# Altium footprint library PCB_IntegratedCircuit.PcbLib: 82 footprints (part 1 of 6)
Each footprint in its own frame and in the unit in brackets; x right, y up, seen from the top. Pads: shape width x height; smd on the part's side, far side on the other; paste and mask are expansions set on the pad; w line width, h text height; cw(c..) or ccw(c..) is an arc to the next point about the centre after c.
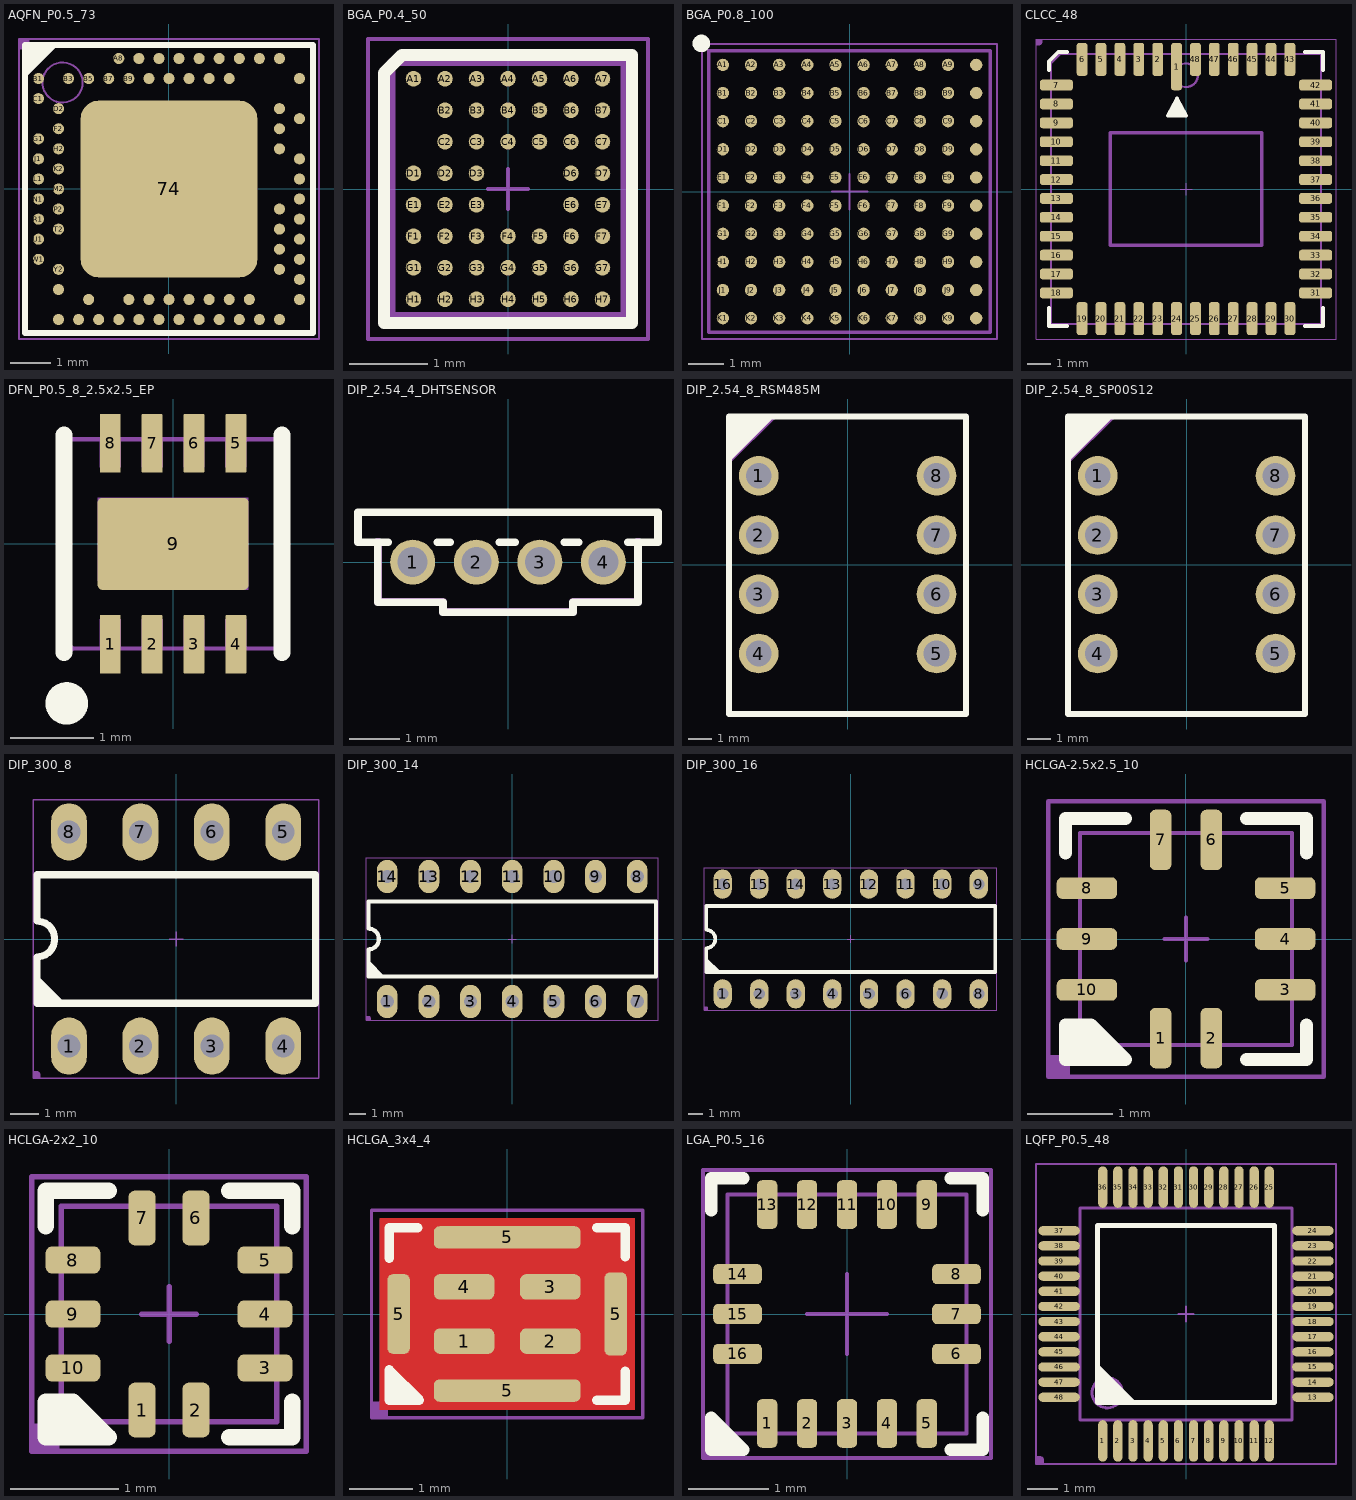
[diagram p0: the footprints below, top view; thin cyan lines are the x and y axes]

## AQFN_P0.5_73 [mm]
height 0.85
pads (74):
  rrect20% 4.4x4.4 smd mask+0.05: 74(0,0)
  round 0.275 smd paste+0.012 mask+0.05: A8(-1.25,3.25) A10(-0.75,3.25) A12(-0.25,3.25) A14(0.25,3.25) A16(0.75,3.25) A18(1.25,3.25) A20(1.75,3.25) A22(2.25,3.25) A23(2.75,3.25) AA24(3.25,-2.25) AB2(-2.75,-2.5) AC5(-2,-2.75) AC9(-1,-2.75) AC11(-0.5,-2.75) AC13(0,-2.75) AC15(0.5,-2.75) AC17(1,-2.75) AC19(1.5,-2.75) AC21(2,-2.75) AC24(3.25,-2.75) AD2(-2.75,-3.25) AD4(-2.25,-3.25) AD6(-1.75,-3.25) AD8(-1.25,-3.25) AD10(-0.75,-3.25) AD12(-0.25,-3.25) AD14(0.25,-3.25) AD16(0.75,-3.25) AD18(1.25,-3.25) AD20(1.75,-3.25) AD22(2.25,-3.25) AD23(2.75,-3.25) B1(-3.25,2.75) B3(-2.5,2.75) B5(-2,2.75) B7(-1.5,2.75) B9(-1,2.75) B11(-0.5,2.75) B13(0,2.75) B15(0.5,2.75) B17(1,2.75) B19(1.5,2.75) B24(3.25,2.75) C1(-3.25,2.25) D2(-2.75,2) D23(2.75,2) E24(3.25,1.75) F2(-2.75,1.5) F23(2.75,1.5) G1(-3.25,1.25) H2(-2.75,1) H23(2.75,1) J1(-3.25,0.75) J24(3.25,0.75) K2(-2.75,0.5) L1(-3.25,0.25) L24(3.25,0.25) M2(-2.75,0) N1(-3.25,-0.25) N24(3.25,-0.25) P2(-2.75,-0.5) P23(2.75,-0.5) R1(-3.25,-0.75) R24(3.25,-0.75) T2(-2.75,-1) T23(2.75,-1) U1(-3.25,-1.25) U24(3.25,-1.25) V23(2.75,-1.5) W1(-3.25,-1.75) W24(3.25,-1.75) Y2(-2.75,-2) Y23(2.75,-2)
Top Overlay:
  region: -2.769,3.581 -3.581,2.769 -3.581,3.581
  lines w0.152: -3.581,-3.581 3.581,-3.581 3.581,3.581 -3.581,3.581 -3.581,-3.581
Mechanical 13:
  circle w0.051: c-2.65,2.65 r0.5
  lines w0.051: -0.5,0 0.5,0 ; 0,-0.5 0,0.5 ; -3.531,-3.531 3.531,-3.531 3.531,3.531 -3.531,3.531 -3.531,-3.531
T-Component:
  region: -3.734,3.734 -3.48,3.734 -3.48,3.607 -3.48,3.582 -3.499,3.535 -3.535,3.499 -3.582,3.48 -3.607,3.48 -3.734,3.48
  lines w0.051: -3.734,-3.734 -3.734,3.734 3.734,3.734 3.734,-3.734 -3.734,-3.734
3D body "LGA88C25P25X25_700X700X85.step": height 0.85, standoff 0, extent -3.55,-3.55 3.55,3.55

## BGA_P0.4_50 [mm]
height 0.4
pads (50):
  round 0.198 smd: A1(-1.2,1.4) A2(-0.8,1.4) A3(-0.4,1.4) A4(0,1.4) A5(0.4,1.4) A6(0.8,1.4) A7(1.2,1.4) B2(-0.8,1) B3(-0.4,1) B4(0,1) B5(0.4,1) B6(0.8,1) B7(1.2,1) C2(-0.8,0.6) C3(-0.4,0.6) C4(0,0.6) C5(0.4,0.6) C6(0.8,0.6) C7(1.2,0.6) D1(-1.2,0.2) D2(-0.8,0.2) D3(-0.4,0.2) D6(0.8,0.2) D7(1.2,0.2) E1(-1.2,-0.2) E2(-0.8,-0.2) E3(-0.4,-0.2) E6(0.8,-0.2) E7(1.2,-0.2) F1(-1.2,-0.6) F2(-0.8,-0.6) F3(-0.4,-0.6) F4(0,-0.6) F5(0.4,-0.6) F6(0.8,-0.6) F7(1.2,-0.6) G1(-1.2,-1) G2(-0.8,-1) G3(-0.4,-1) G4(0,-1) G5(0.4,-1) G6(0.8,-1) G7(1.2,-1) H1(-1.2,-1.4) H2(-0.8,-1.4) H3(-0.4,-1.4) H4(0,-1.4) H5(0.4,-1.4) H6(0.8,-1.4) H7(1.2,-1.4)
Top Overlay:
  lines w0.152: -1.575,-1.702 1.575,-1.702 1.575,1.702 -1.346,1.702 -1.575,1.473 -1.575,-1.702
Mechanical 13:
  lines w0.051: -0.254,0 0.254,0 ; 0,-0.254 0,0.254
  lines w0.1: -1.48,-1.615 1.48,-1.615 1.48,1.615 -1.48,1.615 -1.48,-1.615
T-Component:
  lines w0.051: -1.778,-1.905 1.778,-1.905 1.778,1.905 -1.778,1.905 -1.778,-1.905
3D body "BGA56C40P7X8_296X323X40.step": height 0.4, standoff 0, extent -1.48,-1.615 1.48,1.615

## BGA_P0.8_100 [mm]
height 1.1
pads (100):
  round 0.35 smd: A1(-3.6,3.6) A2(-2.8,3.6) A3(-2,3.6) A4(-1.2,3.6) A5(-0.4,3.6) A6(0.4,3.6) A7(1.2,3.6) A8(2,3.6) A9(2.8,3.6) A10(3.6,3.6) B1(-3.6,2.8) B2(-2.8,2.8) B3(-2,2.8) B4(-1.2,2.8) B5(-0.4,2.8) B6(0.4,2.8) B7(1.2,2.8) B8(2,2.8) B9(2.8,2.8) B10(3.6,2.8) C1(-3.6,2) C2(-2.8,2) C3(-2,2) C4(-1.2,2) C5(-0.4,2) C6(0.4,2) C7(1.2,2) C8(2,2) C9(2.8,2) C10(3.6,2) D1(-3.6,1.2) D2(-2.8,1.2) D3(-2,1.2) D4(-1.2,1.2) D5(-0.4,1.2) D6(0.4,1.2) D7(1.2,1.2) D8(2,1.2) D9(2.8,1.2) D10(3.6,1.2) E1(-3.6,0.4) E2(-2.8,0.4) E3(-2,0.4) E4(-1.2,0.4) E5(-0.4,0.4) E6(0.4,0.4) E7(1.2,0.4) E8(2,0.4) E9(2.8,0.4) E10(3.6,0.4) F1(-3.6,-0.4) F2(-2.8,-0.4) F3(-2,-0.4) F4(-1.2,-0.4) F5(-0.4,-0.4) F6(0.4,-0.4) F7(1.2,-0.4) F8(2,-0.4) F9(2.8,-0.4) F10(3.6,-0.4) G1(-3.6,-1.2) G2(-2.8,-1.2) G3(-2,-1.2) G4(-1.2,-1.2) G5(-0.4,-1.2) G6(0.4,-1.2) G7(1.2,-1.2) G8(2,-1.2) G9(2.8,-1.2) G10(3.6,-1.2) H1(-3.6,-2) H2(-2.8,-2) H3(-2,-2) H4(-1.2,-2) H5(-0.4,-2) H6(0.4,-2) H7(1.2,-2) H8(2,-2) H9(2.8,-2) H10(3.6,-2) J1(-3.6,-2.8) J2(-2.8,-2.8) J3(-2,-2.8) J4(-1.2,-2.8) J5(-0.4,-2.8) J6(0.4,-2.8) J7(1.2,-2.8) J8(2,-2.8) J9(2.8,-2.8) J10(3.6,-2.8) K1(-3.6,-3.6) K2(-2.8,-3.6) K3(-2,-3.6) K4(-1.2,-3.6) K5(-0.4,-3.6) K6(0.4,-3.6) K7(1.2,-3.6) K8(2,-3.6) K9(2.8,-3.6) K10(3.6,-3.6)
Top Overlay:
  circle w0.25: c-4.21,4.21 r0.125
Mechanical 13:
  lines w0.1: -4,-4 -4,4 4,4 4,-4 -4,-4
T-Component:
  lines w0.051: -0.508,0 0.508,0 ; 0,-0.508 0,0.508 ; -4.191,-4.191 -4.191,4.191 4.191,4.191 4.191,-4.191 -4.191,-4.191
3D body "BGA100C80P10X10_800X800X110.step": height 1.1, standoff 0, extent -4,-4 4,4

## CLCC_48 [mil]
height 90.55
pads (48):
  rrect50% 18x79 smd: 1(-15.75,204)
  rrect50% 18x55 smd: 2(-47.24,216) 3(-78.74,216) 4(-110.24,216) 5(-141.73,216) 6(-173.23,216) 19(-173.23,-216) 20(-141.73,-216) 21(-110.24,-216) 22(-78.74,-216) 23(-47.24,-216) 24(-15.75,-216) 25(15.75,-216) 26(47.24,-216) 27(78.74,-216) 28(110.24,-216) 29(141.73,-216) 30(173.23,-216) 43(173.23,216) 44(141.73,216) 45(110.24,216) 46(78.74,216) 47(47.24,216) 48(15.75,216)
  rrect50% 55x18 smd: 7(-216,173.23) 8(-216,141.73) 9(-216,110.24) 10(-216,78.74) 11(-216,47.24) 12(-216,15.75) 13(-216,-15.75) 14(-216,-47.24) 15(-216,-78.74) 16(-216,-110.24) 17(-216,-141.73) 18(-216,-173.23) 31(216,-173.23) 32(216,-141.73) 33(216,-110.24) 34(216,-78.74) 35(216,-47.24) 36(216,-15.75) 37(216,15.75) 38(216,47.24) 39(216,78.74) 40(216,110.24) 41(216,141.73) 42(216,173.23)
Top Overlay:
  region: -15,151 -30.26,122 0.26,122
  lines w6: -228.35,-197.83 -228.35,-228.35 -197.83,-228.35 ; -228.35,197.83 -228.35,213.09 -213.09,228.35 -197.83,228.35 ; 197.83,-228.35 228.35,-228.35 228.35,-197.83 ; 197.83,228.35 228.35,228.35 228.35,197.83 ; -30.26,122 0.26,122 -15,151 -30.26,122
Mechanical 13:
  circle w3.94: c0,189.57 r19.68
  lines w2: -10,0 10,0 ; 0,-10 0,10
  lines w3.94: -225,-225 -225,209.74 -209.74,225 225,225 225,-225 -225,-225
  lines w6: -126,-94 -126,94 126,94 126,-94 -126,-94
T-Component:
  region: -250,250 -240,250 -240,245 -240,244.01 -240.76,242.17 -242.17,240.76 -244.01,240 -245,240 -250,240
  lines w2: -250,-250 250,-250 250,250 -250,250 -250,-250
3D body "User Library-CLCC48.STEP": height 79.69, standoff 0, extent -250,-250 250,250

## DFN_P0.5_8_2.5x2.5_EP [mm]
pads (9):
  rrect10% 0.25x0.7 smd: 1(-0.75,-1.2) 2(-0.25,-1.2) 3(0.25,-1.2) 4(0.75,-1.2) 5(0.75,1.2) 6(0.25,1.2) 7(-0.25,1.2) 8(-0.75,1.2)
  rrect10% 1.8x1.1 smd: 9(0,0)
Top Overlay:
  lines w0.203: -1.3,-1.3 -1.3,1.3 ; 1.3,-1.3 1.3,1.3
  lines w0.254: -1.271,-1.778 ccw(c-1.27,-1.905) -1.269,-1.778
B-Component:
  region: -0.9,-0.44 -0.9,0.55 0.9,0.55 0.9,-0.55 -0.79,-0.55
  region: -0.875,-1.25 -0.875,-0.9 -0.625,-0.9 -0.625,-1.25
  region: -0.375,-1.25 -0.375,-0.9 -0.125,-0.9 -0.125,-1.25
  region: 0.125,-1.25 0.125,-0.9 0.375,-0.9 0.375,-1.25
  region: 0.625,-1.25 0.625,-0.9 0.875,-0.9 0.875,-1.25
  region: 0.625,1.263 0.625,0.913 0.875,0.913 0.875,1.263
  region: 0.125,1.263 0.125,0.913 0.375,0.913 0.375,1.263
  region: -0.375,1.263 -0.375,0.913 -0.125,0.913 -0.125,1.263
  region: -0.875,1.263 -0.875,0.913 -0.625,0.913 -0.625,1.263
  region: -1.19,-1.25 -1.19,-1.225 -1.225,-1.19 -1.275,-1.19 -1.31,-1.225 -1.31,-1.25 -1.31,-1.275 -1.275,-1.31 -1.225,-1.31 -1.19,-1.275
  lines w0.051: -1.25,-1.25 1.25,-1.25 1.25,1.25 -1.25,1.25 -1.25,-1.25
3D body "User Library-DFN8 2_5x2_5mm.step": height 1.06, standoff 0.04, extent -1.25,-1.26 1.25,1.26

## DIP_2.54_4_DHTSENSOR [mm]
pads (4):
  round 0.9 hole 0.6: 1(-1.905,0) 2(-0.635,0) 3(0.635,0) 4(1.905,0)
Top Overlay:
  lines w0.152: -2.601,0.4 -2.601,-0.8 -1.3,-0.8 -1.3,-1 1.3,-1 1.3,-0.8 2.6,-0.8 2.6,0.4 ; -2.391,0.4 -3,0.4 -3,1 3,1 3,0.4 2.6,0.4 ; -1.419,0.4 -1.151,0.4 ; -0.179,0.4 0.149,0.4 ; 1.121,0.4 1.419,0.4 ; 2.391,0.4 2.6,0.4
Mechanical 6:
  region: -2.525,0.4 -2.525,-0.724 -1.3,-0.724 -1.285,-0.724 -1.257,-0.736 -1.236,-0.757 -1.224,-0.785 -1.224,-0.8 -1.224,-0.924 1.224,-0.924 1.224,-0.8 1.224,-0.785 1.236,-0.757 1.257,-0.736 1.285,-0.724 1.3,-0.724 2.524,-0.724 2.524,0.4 2.524,0.431 2.569,0.476 2.631,0.476 2.676,0.431 2.676,0.4 2.676,-0.8 2.676,-0.815 2.664,-0.843 2.643,-0.864 2.615,-0.876 2.6,-0.876 1.376,-0.876 1.376,-1 1.376,-1.015 1.364,-1.043 1.343,-1.064 1.315,-1.076 1.3,-1.076 -1.3,-1.076 -1.315,-1.076 -1.343,-1.064 -1.364,-1.043 -1.376,-1.015 -1.376,-1 -1.376,-0.876 -2.601,-0.876 -2.617,-0.876 -2.644,-0.864 -2.666,-0.843 -2.677,-0.815 -2.677,-0.8 -2.677,0.4 -2.677,0.431 -2.633,0.476 -2.57,0.476 -2.525,0.431
B-Component:
  region: 1.705,0.2 2.105,0.2 2.105,-0.2 1.705,-0.2
  region: 0.435,0.2 0.835,0.2 0.835,-0.2 0.435,-0.2
  region: -0.835,0.2 -0.435,0.2 -0.435,-0.2 -0.835,-0.2
  region: -2.105,0.2 -1.705,0.2 -1.705,-0.2 -2.105,-0.2
  lines w0.051: -3,0.4 -3,1 3,1 3,0.4 2.6,0.4 2.6,-0.8 1.3,-0.8 1.3,-1 -1.3,-1 -1.3,-0.8 -2.6,-0.8 -2.6,0.4 -3,0.4
3D body "3D_PCB1_2024-05-11.step": height 14.72, standoff -2.98, extent -3,-1 3,1

## DIP_2.54_8_RSM485M [mm]
pads (8):
  round 1.7 hole 1.1: 1(-3.81,3.81) 2(-3.81,1.27) 3(-3.81,-1.27) 4(-3.81,-3.81) 5(3.81,-3.81) 6(3.81,-1.27) 7(3.81,1.27) 8(3.81,3.81)
Top Overlay:
  region: -5.08,6.35 -5.08,4.42 -3.15,6.35
  lines w0.254: -5.08,-6.401 5.08,-6.401 5.08,6.35 -5.08,6.35 -5.08,-6.401
Mechanical 6:
  region: -5.08,6.35 -5.08,4.318 -3.048,6.35
B-Component:
  drawing of 13 lines, arcs and shapes, not listed
3D body "3D_PCB1_2024-05-09.step": height 7.72, standoff -3.48, extent -5.1,-6.4 5.1,6.4

## DIP_2.54_8_SP00S12 [mm]
pads (8):
  round 1.7 hole 1.1: 1(-3.81,3.81) 2(-3.81,1.27) 3(-3.81,-1.27) 4(-3.81,-3.81) 5(3.81,-3.81) 6(3.81,-1.27) 7(3.81,1.27) 8(3.81,3.81)
Top Overlay:
  region: -5.08,6.35 -5.08,4.42 -3.15,6.35
  lines w0.254: -5.08,-6.401 5.08,-6.401 5.08,6.35 -5.08,6.35 -5.08,-6.401
Mechanical 6:
  region: -5.08,6.35 -5.08,4.318 -3.048,6.35
B-Component:
  drawing of 13 lines, arcs and shapes, not listed
3D body "3D_PCB1_2024-05-10.step": height 7.72, standoff -3.98, extent -5.105,-6.4 5.105,6.4

## DIP_300_8 [mil]
pads (8):
  oval 50x80 hole 32: 1(-150,-150) 2(-50,-150) 3(50,-150) 4(150,-150) 5(150,150) 6(50,150) 7(-50,150) 8(-150,150)
Top Overlay:
  region: -194.69,-90 -194.69,-50.63 -155.31,-90
  lines w10: -195,-90 195,-90 195,90 -195,90 -195,25 cw(c-195,0) -195,-25 -195,-90
Mechanical 13:
  lines w2: -10,0 10,0 ; 0,-10 0,10
T-Component:
  region: -200,-195 -200,-185 -195,-185 -194.01,-185 -192.17,-185.76 -190.76,-187.17 -190,-189.01 -190,-190 -190,-195
  lines w2: -200,-195 200,-195 200,195 -200,195 -200,-195
3D body "User Library-DIP8test.STEP": height 179.92, standoff -150, extent -195.08,-153.94 195.07,153.94

## DIP_300_14 [mil]
pads (14):
  oval 50x80 hole 32: 1(-300,-150) 2(-200,-150) 3(-100,-150) 4(0,-150) 5(100,-150) 6(200,-150) 7(300,-150) 8(300,150) 9(200,150) 10(100,150) 11(0,150) 12(-100,150) 13(-200,150) 14(-300,150)
Top Overlay:
  region: -344.69,-90 -344.69,-50.63 -305.31,-90
  lines w10: -345,-90 345,-90 345,90 -345,90 -345,25 cw(c-345,0) -345,-25 -345,-90
Mechanical 13:
  lines w2: -10,0 10,0 ; 0,-10 0,10
T-Component:
  region: -350,-195 -350,-185 -345,-185 -344.01,-185 -342.17,-185.76 -340.76,-187.17 -340,-189.01 -340,-190 -340,-195
  lines w2: -350,-195 -350,195 350,195 350,-195 -350,-195
3D body "SW3dPS-DIP14-300.STEP": height 200, standoff -98.03, extent -383.86,-154.92 383.86,154.93

## DIP_300_16 [mil]
pads (16):
  oval 50x80 hole 32: 1(-350,-150) 2(-250,-150) 3(-150,-150) 4(-50,-150) 5(50,-150) 6(150,-150) 7(250,-150) 8(350,-150) 9(350,150) 10(250,150) 11(150,150) 12(50,150) 13(-50,150) 14(-150,150) 15(-250,150) 16(-350,150)
Top Overlay:
  region: -394.69,-90 -394.69,-50.63 -355.31,-90
  lines w10: -395,-90 -395,-25 ccw(c-395,0) -395,25 -395,90 395,90 395,-90 -395,-90
Mechanical 13:
  lines w2: -10,0 10,0 ; 0,-10 0,10
T-Component:
  region: -400,-195 -400,-185 -395,-185 -394.01,-185 -392.17,-185.76 -390.76,-187.17 -390,-189.01 -390,-190 -390,-195
  lines w2: -400,-195 400,-195 400,195 -400,195 -400,-195
3D body "User Library-DIP16-22mm.STEP": height 202.76, standoff -98.03, extent -433.07,-155 433.07,154.84

## HCLGA-2.5x2.5_10 [mil]
height 31.5
pads (10):
  rrect50% 10x28 smd: 1(-11.81,-46) 2(11.81,-46) 6(11.81,46) 7(-11.81,46)
  rrect50% 28x10 smd: 3(46,-23.62) 4(46,0) 5(46,23.62) 8(-46,23.62) 9(-46,0) 10(-46,-23.62)
Top Overlay:
  region: -44,-40 -56,-40 -56,-56 -28,-56
  lines w6: -56,40 -56,56 -28,56 ; 28,-56 56,-56 56,-40 ; 28,56 56,56 56,40 ; -56,-56 -56,-40 -44,-40 -28,-56 -56,-56
Top Solder:
  region: 11.81,-32 -11.81,-32 -11.81,-60 11.81,-60
  region: 11.81,60 -11.81,60 -11.81,32 11.81,32
  region: 32,23.62 32,-23.62 60,-23.62 60,23.62
  region: -32,-23.62 -32,23.62 -60,23.62 -60,-23.62
Mechanical 13:
  lines w2: -10,0 10,0 ; 0,-10 0,10 ; -49.22,-49.21 -49.22,49.22 49.21,49.22 49.21,-49.21 -49.22,-49.21
T-Component:
  region: -64,-64 -64,-54 -59,-54 -58.01,-54 -56.17,-54.76 -54.76,-56.17 -54,-58.01 -54,-59 -54,-64
  lines w2: -64,-64 -64,64 64,64 64,-64 -64,-64
3D body "PQFN60P250X250X80-10N.step": height 31.5, standoff -0.04, extent -49.22,-49.21 49.21,49.22

## HCLGA-2x2_10 [mil]
height 31.5
pads (10):
  rrect50% 10x20 smd: 1(-9.84,-35) 2(9.84,-35) 6(9.84,35) 7(-9.84,35)
  rrect50% 20x10 smd: 3(35,-19.68) 4(35,0) 5(35,19.68) 8(-35,19.68) 9(-35,0) 10(-35,-19.68)
Top Overlay:
  region: -45,-32 -45,-45 -22,-45 -35,-32
  lines w6: -45,32 -45,45 -22,45 ; 22,-45 45,-45 45,-32 ; 22,45 45,45 45,32 ; -45,-45 -22,-45 -35,-32 -45,-32 -45,-45
Top Solder:
  region: 45,-19.69 45,19.69 25,19.69 25,-19.69
  region: -45,19.69 -45,-19.68 -25,-19.69 -25,19.68
  region: 9.84,45 -9.84,45 -9.84,25 9.84,25
  region: 9.84,-25 -9.84,-25 -9.84,-45 9.84,-45
Mechanical 13:
  lines w2: -10,0 10,0 ; 0,-10 0,10 ; -39.37,-39.37 -39.37,39.37 39.37,39.37 39.37,-39.37 -39.37,-39.37
T-Component:
  region: -50,-50 -50,-40 -45,-40 -44.01,-40 -42.17,-40.76 -40.76,-42.17 -40,-44.01 -40,-45 -40,-50
  lines w2: -50,-50 -50,50 50,50 50,-50 -50,-50
3D body "PQFN50P200X200X80-10N.step": height 31.5, standoff -0.04, extent -39.37,-39.37 39.37,39.37

## HCLGA_3x4_4 [mil]
pads (8):
  rrect50% 38x16 smd: 1(-27,-17) 2(27,-17) 3(27,17) 4(-27,17)
  rrect50% 14x50 smd: 5(-68,0)
  rrect50% 92x14 smd: 5(0,-48) 5(0,48)
  rrect50% 14x52 smd: 5(68,0)
Top Layer:
  pour cut-out: -80,-60 -80,60 80,60 80,-60
Top Overlay:
  region: -74,-54 -74,-35 -55,-54
  lines w6: -74,35 -74,54 -56,54 ; 56,-54 74,-54 74,-36 ; 56,54 74,54 74,36 ; -74,-54 -55,-54 -74,-35 -74,-54
Mechanical 13:
  lines w2: -10,0 10,0 ; 0,-10 0,10 ; -79,-59 -79,59 79,59 79,-59 -79,-59
T-Component:
  region: -85,-65 -85,-55 -80,-55 -79.01,-55 -77.17,-55.76 -75.76,-57.17 -75,-59.01 -75,-60 -75,-65
  lines w2: -85,-65 -85,65 85,65 85,-65 -85,-65
3D body "User Library-DFN12(3x4).STEP": height 29.92, standoff 0, extent -78.74,-59.08 78.74,59.1

## LGA_P0.5_16 [mil]
height 29.53
pads (16):
  rrect50% 10x24 smd: 1(-39.37,-54) 2(-19.68,-54) 3(0,-54) 4(19.68,-54) 5(39.37,-54) 9(39.37,54) 10(19.68,54) 11(0,54) 12(-19.68,54) 13(-39.37,54)
  rrect50% 24x10 smd: 6(54,-19.68) 7(54,0) 8(54,19.68) 14(-54,19.68) 15(-54,0) 16(-54,-19.68)
Top Overlay:
  region: -67,-67 -67,-51 -51,-67
  lines w6: -67,51 -67,67 -51,67 ; 51,-67 67,-67 67,-51 ; 51,67 67,67 67,51 ; -67,-67 -51,-67 -67,-51 -67,-67
Top Solder:
  region: 41,20 41,-20 67,-20 67,20
  region: 40,-41 -40,-41 -40,-67 40,-67
  rectangle: -40,41 40,67
  region: -41,-20 -41,20 -67,20 -67,-20
Mechanical 13:
  lines w2: -19.68,0 19.68,0 ; 0,-19.68 0,19.68 ; -59.06,-59.06 -59.06,59.06 59.06,59.06 59.06,-59.06 -59.06,-59.06
T-Component:
  region: -71,-71 -71,-61 -66,-61 -65.01,-61 -63.17,-61.76 -61.76,-63.17 -61,-65.01 -61,-66 -61,-71
  lines w2: -71,-71 -71,71 71,71 71,-71 -71,-71
3D body "PQFN50P300X300X75-16L.step": height 29.53, standoff 0, extent -59.06,-59.06 59.06,59.06

## LQFP_P0.5_48 [mil]
height 62.99
pads (48):
  oval 12x54 smd: 1(-108.27,-165) 2(-88.58,-165) 3(-68.9,-165) 4(-49.21,-165) 5(-29.53,-165) 6(-9.84,-165) 7(9.84,-165) 8(29.53,-165) 9(49.21,-165) 10(68.9,-165) 11(88.58,-165) 12(108.27,-165) 25(108.27,165) 26(88.58,165) 27(68.9,165) 28(49.21,165) 29(29.53,165) 30(9.84,165) 31(-9.84,165) 32(-29.53,165) 33(-49.21,165) 34(-68.9,165) 35(-88.58,165) 36(-108.27,165)
  oval 54x12 smd: 13(165,-108.27) 14(165,-88.58) 15(165,-68.9) 16(165,-49.21) 17(165,-29.53) 18(165,-9.84) 19(165,9.84) 20(165,29.53) 21(165,49.21) 22(165,68.9) 23(165,88.58) 24(165,108.27) 37(-165,108.27) 38(-165,88.58) 39(-165,68.9) 40(-165,49.21) 41(-165,29.53) 42(-165,9.84) 43(-165,-9.84) 44(-165,-29.53) 45(-165,-49.21) 46(-165,-68.9) 47(-165,-88.58) 48(-165,-108.27)
Top Overlay:
  region: -115,-115 -115,-65 -65,-115
  lines w6: -115,-115 115,-115 115,115 -115,115 -115,-115
Mechanical 13:
  circle w3.94: c-102.36,-102.36 r19.68
  lines w2: -10,0 10,0 ; 0,-10 0,10
  lines w3.94: -137.8,-137.8 137.8,-137.8 137.8,137.8 -137.8,137.8 -137.8,-137.8
T-Component:
  region: -195,-195 -195,-185 -190,-185 -189.01,-185 -187.17,-185.76 -185.76,-187.17 -185,-189.01 -185,-190 -185,-195
  lines w2: -195,-195 195,-195 195,195 -195,195 -195,-195
3D body "SW3dPS-Quad50M48.STEP": height 61.42, standoff 0, extent -176.67,-177.16 177.66,177.17